# Altium schematic symbol library NXP_60_26022015.SCHLIB: 1306 symbols (part 6 of 28) (continued)
## BAT17
designator D?, comment Schottky barrier diode Planar Schottky barrier diode in a small SOT23 plastic SMD package.   AAL Eindhoven MK
footprint SOT23
pins: 1 A, 3 K

## BAT18
designator D?, comment Silicon planar diode Planar high performance band-switching diode in a small rectangular SOT23 SMD plastic package.   AAL Eindhoven MK
footprint SOT23
pins: 1 A, 3 K

## BAT46WH
designator ?, comment Single Schottky barrier diode Single planar Schottky barrier diode with an integrated guard ring for stress protection, encapsulated in a Surface-Mounted Device (SMD) plastic package.   AAL Eindhoven MK
footprint SOD123F
pins: 1 K, 2 A

## BAT46WJ
designator ?, comment Single Schottky barrier diode Single planar Schottky barrier diode with an integrated guard ring for stress protection, encapsulated in a Surface-Mounted Device (SMD) plastic package.   AAL Eindhoven MK
footprint SOD323(F)
pins: 1 K, 2 A

## BAT54
designator D?, comment Schottky barrier diode Planar Schottky barrier diode encapsulated in small plastic SMD packages. Single diodes and double diodes with different pinning are available   AAL Eindhoven MK
footprint SOT23
pins: 1 A, 3 K

## BAT54A
designator D?, comment Schottky barrier (double) diodes Planar Schottky barrier diodes encapsulated in a SOT23 small plastic SMD package. Single diodes and double diodes with different pinning are available.   AAL Eindhoven MK
footprint SOT23
pins: 1 K1, 2 K2, 3 A1A2

## BAT54AW
designator D?, comment Schottky barrier (double) diodes Planar Schottky barrier diodes encapsulated in a SOT23 small plastic SMD package. Single diodes and double diodes with different pinning are available.   AAL Eindhoven MK
footprint SOT323
pins: 1 K1, 2 K2, 3 A1A2

## BAT54C
designator D?, comment Schottky barrier (double) diodes Planar Schottky barrier diodes encapsulated in a SOT23 small plastic SMD package. Single diodes and double diodes with different pinning are available.   AAL Eindhoven MK
footprint SOT23
pins: 1 A1, 2 A2, 3 K1K2

## BAT54CM
designator D?, comment Schottky barrier (double) diodes Planar Schottky barrier diodes encapsulated in a SOT23 small plastic SMD package. Single diodes and double diodes with different pinning are available.   AAL Eindhoven MK
footprint SOT883(B)
pins: 1 A1, 2 A2, 3 K1K2

## BAT54CV
designator D?, comment Two Schottky barrier double diodes  Two planar Schottky barrier double diodes with common cathodes and an integrated guard ring for stress protection encapsulated in a SOT666 ultra small and flat lead Surface-Mounted Device (SMD) plastic package.   AAL Eindhoven MK
footprint SOT666
part A pins: 1 A1, 2 A2, 6 K1K2
part B pins: 3 K1K2, 4 A2, 5 A1

## BAT54CW
designator D?, comment Schottky barrier (double) diodes Planar Schottky barrier diodes encapsulated in a SOT23 small plastic SMD package. Single diodes and double diodes with different pinning are available.   AAL Eindhoven MK
footprint SOT323
pins: 1 A1, 2 A2, 3 K1K2

## BAT54H
designator D?, comment Schottky barrier diode Planar Schottky barrier diode encapsulated in small plastic SMD packages. Single diodes and double diodes with different pinning are available   AAL Eindhoven MK
footprint SOD123F
pins: 1 K, 2 A

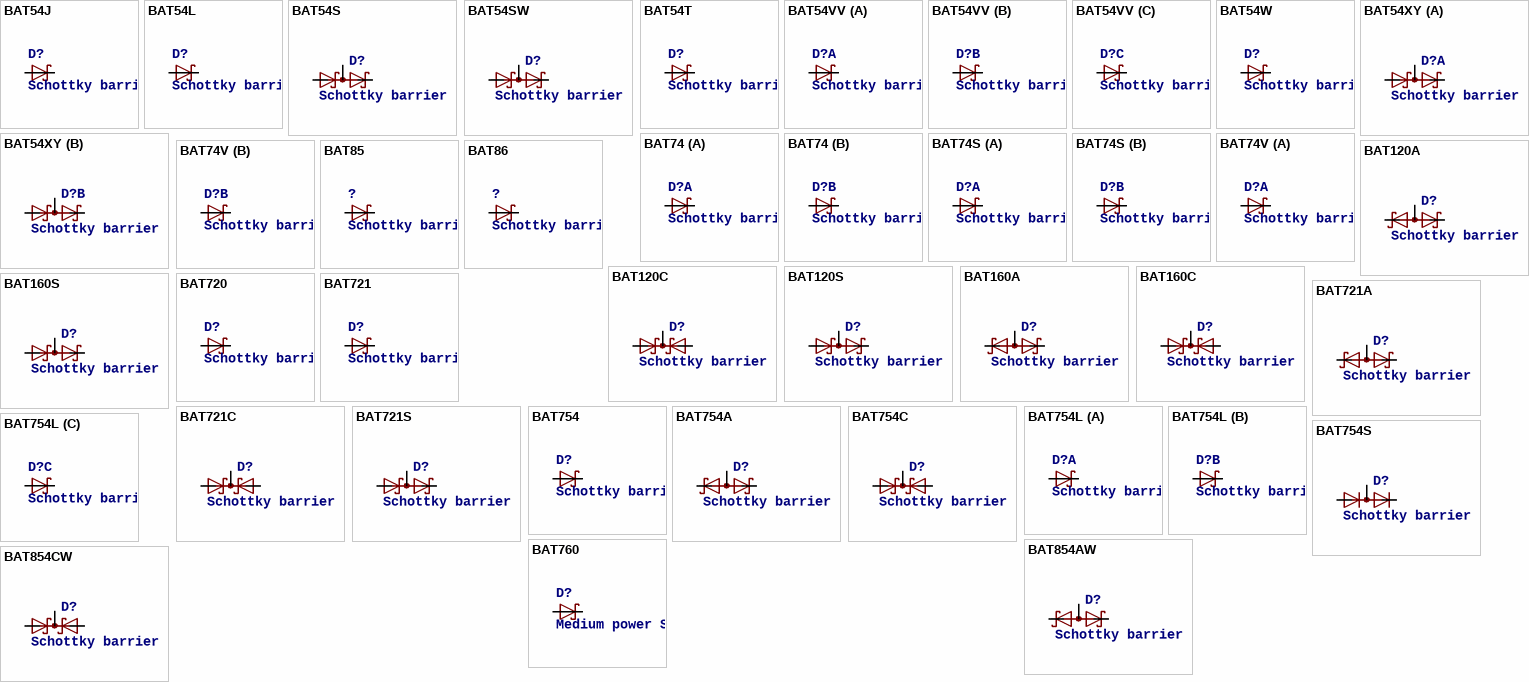
[diagram p31: symbols BAT54J to BAT854CW]

## BAT54J
designator D?, comment Schottky barrier diode Planar Schottky barrier diode encapsulated in small plastic SMD packages. Single diodes and double diodes with different pinning are available   AAL Eindhoven MK
footprint SOD323(F)
pins: 1 K, 2 A

## BAT54L
designator D?, comment Schottky barrier diode Planar Schottky barrier diode encapsulated in small plastic SMD packages. Single diodes and double diodes with different pinning are available   AAL Eindhoven MK
footprint SOD882(T)
pins: 1 K, 2 A

## BAT54S
designator D?, comment Schottky barrier (double) diodes Planar Schottky barrier diodes encapsulated in a SOT23 small plastic SMD package. Single diodes and double diodes with different pinning are available.   AAL Eindhoven MK
footprint SOT23
pins: 1 A1, 2 K2, 3 K1A2

## BAT54SW
designator D?, comment Schottky barrier (double) diodes Planar Schottky barrier diodes encapsulated in a SOT23 small plastic SMD package. Single diodes and double diodes with different pinning are available.   AAL Eindhoven MK
footprint SOT323
pins: 1 A1, 2 K2, 3 K1A2

## BAT54T
designator D?, comment Schottky barrier diode Planar Schottky barrier diode encapsulated in small plastic SMD packages. Single diodes and double diodes with different pinning are available   AAL Eindhoven MK
footprint SOT416
pins: 1 A, 3 K

## BAT54VV
designator D?, comment Schottky barrier triple diode Planar Schottky barrier triple diode with an integrated guard ring for stress protection. Three electrically isolated Schottky barrier diodes, encapsulated in a SOT666 ultra small SMD plastic package.   AAL Eindhoven MK
footprint SOT666
part A pins: 1 A, 6 K
part B pins: 2 A, 5 K
part C pins: 3 A, 4 K

## BAT54W
designator D?, comment Schottky barrier diode Planar Schottky barrier diode encapsulated in small plastic SMD packages. Single diodes and double diodes with different pinning are available   AAL Eindhoven MK
footprint SOT323
pins: 1 A, 3 K

## BAT54XY
designator D?, comment Schottky barrier quadruple diode in very small SOT363 package  Schottky barrier quadruple diode with an integrated guard ring for stress protection. Two electrically isolated dual Schottky barrier diodes series, encapsulated in a SOT363 very small SMD plastic package.   AAL Eindhoven MK
footprint SOT363
part A pins: 1 A1, 2 K2, 6 K1A2
part B pins: 3 K1A2, 4 A1, 5 K2

## BAT74
designator D?, comment Schottky barrier double diode Planar Schottky barrier double diode with an integrated guard ring for stress protection. Two electrically isolated Schottky barrier diodes, encapsulated in a small SOT143B Surface-Mounted Device (SMD) plastic package.   AAL Eindhoven MK
footprint SOT143(B)
part A pins: 1 K, 4 A
part B pins: 2 K, 3 A

## BAT74S
designator D?, comment Schottky barrier double diode Planar Schottky barrier double diode with an integrated guard ring for stress protection. Two electrically isolated Schottky barrier diodes, encapsulated in a small SOT143B Surface-Mounted Device (SMD) plastic package.   AAL Eindhoven MK
footprint SOT363
part A pins: 1 A, 6 K
part B pins: 3 K, 4 A

## BAT74V
designator D?, comment Schottky barrier double diode Planar Schottky barrier double diode with an integrated guard ring for stress protection. Two electrically isolated Schottky barrier diodes, encapsulated in a small SOT143B Surface-Mounted Device (SMD) plastic package.   AAL Eindhoven MK
footprint SOT666
part A pins: 1 A, 6 K
part B pins: 3 K, 4 A

## BAT85
designator ?, comment Schottky barrier diode  Planar Schottky barrier diode with an integrated protection ring against static discharges, encapsulated in a hermetically-sealed subminiature SOD68 (DO-34) package. The diode is suitable for mounting on a 2 E (5.08 mm) pitch.   AAL Eindhoven MK
footprint SOD68
pins: A, C K

## BAT86
designator ?, comment Schottky barrier diode  Planar Schottky barrier diode with an integrated protection ring against static discharges, encapsulated in a hermetically-sealed subminiature SOD68 (DO-34) package. The diode is suitable for mounting on a 2 E (5.08 mm) pitch.   AAL Eindhoven MK
footprint SOD68
pins: A, C K

## BAT120A
designator D?, comment Schottky barrier double diodes Planar Schottky barrier double diodes encapsulated in a SOT223 plastic SMD package.   AAL Eindhoven MK
footprint SOT223
pins: 1 K1, 3 K2, 4 A1A2

## BAT120C
designator D?, comment Schottky barrier double diodes Planar Schottky barrier double diodes encapsulated in a SOT223 plastic SMD package.   AAL Eindhoven MK
footprint SOT223
pins: 1 A1, 3 A2, 4 K1K2

## BAT120S
designator D?, comment Schottky barrier double diodes Planar Schottky barrier double diodes encapsulated in a SOT223 plastic SMD package.   AAL Eindhoven MK
footprint SOT223
pins: 1 A1, 3 K2, 4 K1A2

## BAT160A
designator D?, comment Schottky barrier double diodes Planar Schottky barrier double diodes encapsulated in a SOT223 plastic SMD package.   AAL Eindhoven MK
footprint SOT223
pins: 1 K1, 3 K2, 4 A1A2

## BAT160C
designator D?, comment Schottky barrier double diodes Planar Schottky barrier double diodes encapsulated in a SOT223 plastic SMD package.   AAL Eindhoven MK
footprint SOT223
pins: 1 A1, 3 A2, 4 K1K2

## BAT160S
designator D?, comment Schottky barrier double diodes Planar Schottky barrier double diodes encapsulated in a SOT223 plastic SMD package.   AAL Eindhoven MK
footprint SOT223
pins: 1 A1, 3 K2, 4 K1A2

## BAT720
designator D?, comment Schottky barrier diode Planar Schottky barrier diode with an integrated guard ring for stress protection in a small SOT23 plastic SMD package.   AAL Eindhoven MK
footprint SOT23
pins: 1 A, 3 K

## BAT721
designator D?, comment Schottky barrier diodes in small packages Planar Schottky barrier diodes with an integrated guard ring for stress protection. Encapsulated in small Surface-Mounted Device (SMD) plastic packages.   AAL Eindhoven MK
footprint SOT23
pins: 1 A, 3 K

## BAT721A
designator D?, comment Schottky barrier diodes in small packages Planar Schottky barrier diodes with an integrated guard ring for stress protection. Encapsulated in small Surface-Mounted Device (SMD) plastic packages.   AAL Eindhoven MK
footprint SOT23
pins: 1 K1, 2 K2, 3 A1A2

## BAT721C
designator D?, comment Schottky barrier diodes in small packages Planar Schottky barrier diodes with an integrated guard ring for stress protection. Encapsulated in small Surface-Mounted Device (SMD) plastic packages.   AAL Eindhoven MK
footprint SOT23
pins: 1 A1, 2 A2, 3 K1K2

## BAT721S
designator D?, comment Schottky barrier diodes in small packages Planar Schottky barrier diodes with an integrated guard ring for stress protection. Encapsulated in small Surface-Mounted Device (SMD) plastic packages.   AAL Eindhoven MK
footprint SOT23
pins: 1 A1, 2 K2, 3 K1A2

## BAT754
designator D?, comment Schottky barrier diode Planar Schottky barrier diodes encapsulated in a SOT23 small plastic SMD package. Low forward voltage selection of the BAT54 series. Single diodes and double diodes with different pinning are available.   AAL Eindhoven MK
footprint SOT23
pins: 1 A, 3 K

## BAT754A
designator D?, comment Schottky barrier (double) diodes Planar Schottky barrier diodes encapsulated in a SOT23 small plastic SMD package. Low forward voltage selection of the BAT54 series. Single diodes and double diodes with different pinning are available.   AAL Eindhoven MK
footprint SOT23
pins: 1 K1, 2 K2, 3 A1A2

## BAT754C
designator D?, comment Schottky barrier (double) diodes Planar Schottky barrier diodes encapsulated in a SOT23 small plastic SMD package. Low forward voltage selection of the BAT54 series. Single diodes and double diodes with different pinning are available.   AAL Eindhoven MK
footprint SOT23
pins: 1 A1, 2 A2, 3 K1K2

## BAT754L
designator D?, comment Schottky barrier triple diode Three internal (galvanic) isolated silicon epitaxial Schottky barrier diodes in a SOT363 small SMD plastic package.   AAL Eindhoven MK
footprint SOT363
part A pins: 1 A, 6 K
part B pins: 2 A, 5 K
part C pins: 3 A, 4 K

## BAT754S
designator D?, comment Schottky barrier (double) diodes Planar Schottky barrier diodes encapsulated in a SOT23 small plastic SMD package. Low forward voltage selection of the BAT54 series. Single diodes and double diodes with different pinning are available.   AAL Eindhoven MK
footprint SOT23
pins: 1 A1, 2 K2, 3 K1A2

## BAT760
designator D?, comment Medium power Schottky barrier single diode Planar medium power Schottky barrier single diode with an integrated guard ring for stress protection, encapsulated in a SOD323 (SC-76) very small Surface-Mounted Device SMD plastic package.   AAL Eindhoven MK
footprint SOD323(F)
pins: 1 K, 2 A

## BAT854AW
designator D?, comment Schottky barrier (double) diodes Planar Schottky barrier diodes encapsulated in a SOT323 very small SMD plastic package. Single diodes and double diodes with different pinning are available.   AAL Eindhoven MK
footprint SOT323
pins: 1 K1, 2 K2, 3 A1A2

## BAT854CW
designator D?, comment Schottky barrier (double) diodes Planar Schottky barrier diodes encapsulated in a SOT323 very small SMD plastic package. Single diodes and double diodes with different pinning are available.   AAL Eindhoven MK
footprint SOT323
pins: 1 A1, 2 A2, 3 K1K2

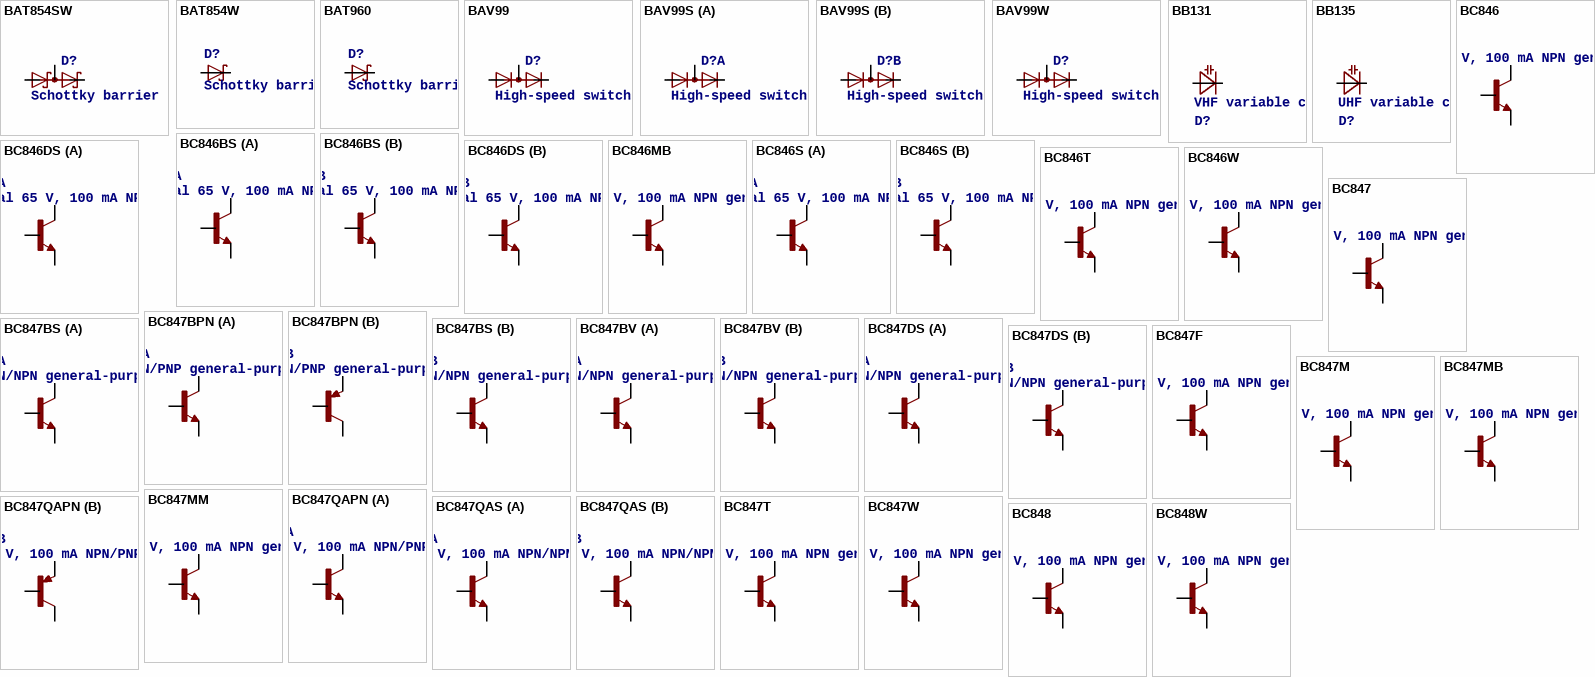
[diagram p32: symbols BAT854SW to BC848W]

## BAT854SW
designator D?, comment Schottky barrier (double) diodes Planar Schottky barrier diodes encapsulated in a SOT323 very small SMD plastic package. Single diodes and double diodes with different pinning are available.   AAL Eindhoven MK
footprint SOT323
pins: 1 A1, 2 K2, 3 K1A2

## BAT854W
designator D?, comment Schottky barrier (double) diodes Planar Schottky barrier diodes encapsulated in a SOT323 very small SMD plastic package. Single diodes and double diodes with different pinning are available.   AAL Eindhoven MK
footprint SOT323
pins: 1 A, 3 K

## BAT960
designator D?, comment Schottky barrier diode  Planar Schottky barrier diode with an integrated guard ring for stress protection in a SOT666 ultra small SMD plastic package.   AAL Eindhoven MK
footprint SOT666
pins: 1 2 5 6 K, 3 4 A

## BAV99
designator D?, comment High-speed switching diode High-speed switching diodes, encapsulated in small Surface-Mounted Device (SMD) plastic packages.    AAL Eindhoven MK
footprint SOT23
pins: 1 A1, 2 K2, 3 K1A2

## BAV99S
designator D?, comment High-speed switching diode High-speed switching diodes, encapsulated in small Surface-Mounted Device (SMD) plastic packages.    AAL Eindhoven MK
footprint SOT363
part A pins: 1 A1, 2 K2, 6 K1A2
part B pins: 3 K1A2, 4 A1, 5 K2

## BAV99W
designator D?, comment High-speed switching diode High-speed switching diodes, encapsulated in small Surface-Mounted Device (SMD) plastic packages.    AAL Eindhoven MK
footprint SOT323
pins: 1 A1, 2 K2, 3 K1A2

## BB131
designator D?, comment VHF variable capacitance diode The BB131 is a variable capacitance diode, fabricated in planar technology, and encapsulated in the SOD323 (SC-76) very small plastic SMD package   AAL Eindhoven MK
footprint SOD323(F)
pins: 1 K, 2 A

## BB135
designator D?, comment UHF variable capacitance diode The BB135 is a variable capacitance diode, fabricated in planar technology, and encapsulated in the SOD323 very small plastic SMD package.The matched type, BB134 has the same specification.e   AAL Eindhoven MK
footprint SOD323(F)
pins: 1 K, 2 A

## BC846
designator T?, comment 65 V, 100 mA NPN general-purpose transistors    AAL Eindhoven  MK
footprint SOT23
pins: 1 B, 2 E, 3 C

## BC846BS
designator T?, comment Dual 65 V, 100 mA NPN/NPN general-purpose transistor    AAL Eindhoven MK
footprint SOT363
part A pins: 1 E, 2 B, 6 C
part B pins: 3 C, 4 E, 5 B

## BC846DS
designator T?, comment Dual 65 V, 100 mA NPN/NPN general-purpose transistor    AAL Eindhoven MK
footprint SOT457
part A pins: 1 E, 2 B, 6 C
part B pins: 3 C, 4 E, 5 B

## BC846MB
designator T?, comment 65 V, 100 mA NPN general-purpose transistors    AAL Eindhoven  MK
footprint SOT883(B)
pins: 1 B, 2 E, 3 C

## BC846S
designator T?, comment Dual 65 V, 100 mA NPN/NPN general-purpose transistor    AAL Eindhoven MK
footprint SOT363
part A pins: 1 E, 2 B, 6 C
part B pins: 3 C, 4 E, 5 B

## BC846T
designator T?, comment 65 V, 100 mA NPN general-purpose transistors    AAL Eindhoven  MK
footprint SOT416
pins: 1 B, 2 E, 3 C

## BC846W
designator T?, comment 65 V, 100 mA NPN general-purpose transistors    AAL Eindhoven  MK
footprint SOT323
pins: 1 B, 2 E, 3 C

## BC847
designator T?, comment 45 V, 100 mA NPN general-purpose transistors NPN general-purpose transistor    AAL Eindhoven MK
footprint SOT23
pins: 1 B, 2 E, 3 C

## BC847BPN
designator T?, comment NPN/PNP general-purpose transistor pair in a very small SOT363 (SC-88) Surface-Mounted Device (SMD) plastic package.    AAL Eindhoven MK
footprint SOT363
part A pins: 1 E, 2 B, 6 C
part B pins: 3 C, 4 E, 5 B

## BC847BS
designator T?, comment NPN/NPN general-purpose transistor pair in a very small SOT363 (SC-88) Surface-Mounted Device (SMD) plastic package.    AAL Eindhoven MK
footprint SOT363
part A pins: 1 E, 2 B, 6 C
part B pins: 3 C, 4 E, 5 B

## BC847BV
designator T?, comment NPN/NPN general-purpose transistor pair in a very small SOT363 (SC-88) Surface-Mounted Device (SMD) plastic package.    AAL Eindhoven MK
footprint SOT666
part A pins: 1 E, 2 B, 6 C
part B pins: 3 C, 4 E, 5 B

## BC847DS
designator T?, comment NPN/NPN general-purpose transistor pair in a small SOT457 (SC-74) Surface-Mounted Device (SMD) plastic package.    AAL Eindhoven MK
footprint SOT457
part A pins: 1 E, 2 B, 6 C
part B pins: 3 C, 4 E, 5 B

## BC847F
designator T?, comment 45 V, 100 mA NPN general-purpose transistors NPN general-purpose transistor    AAL Eindhoven MK
footprint SOT490
pins: 1 B, 2 E, 3 C

## BC847M
designator T?, comment 45 V, 100 mA NPN general-purpose transistors NPN general-purpose transistor    AAL Eindhoven MK
footprint SOT883(B)
pins: 1 B, 2 E, 3 C

## BC847MB
designator T?, comment 45 V, 100 mA NPN general-purpose transistors NPN general-purpose transistor    AAL Eindhoven MK
footprint SOT883(B)
pins: 1 B, 2 E, 3 C

## BC847MM
designator T?, comment 45 V, 100 mA NPN general-purpose transistors NPN general-purpose transistor    AAL Eindhoven MK
footprint SOT1263
pins: 1 B, 2 E, 3 C

## BC847QAPN
designator T?, comment 45 V, 100 mA NPN/PNP general-purpose transistor NPN/PNP general-purpose transistor in a leadless ultra small DFN1010B-6 (SOT1216) Surface-Mounted Device (SMD) plastic package.    AAL Eindhoven MK
footprint SOT1216
part A pins: 1 E, 2 B, 6 C
part B pins: 3 C, 4 E, 5 B

## BC847QAS
designator T?, comment 45 V, 100 mA NPN/NPN general-purpose transistor NPN/NPN general-purpose transistor in a leadless ultra small DFN1010B-6 (SOT1216) Surface-Mounted Device (SMD) plastic package. PNP/PNP complement: BC857QAS. NPN/PNP complement: BC847QAPN.    AAL Eindhoven MK
footprint SOT1216
part A pins: 1 E, 2 B, 6 C
part B pins: 3 C, 4 E, 5 B

## BC847T
designator T?, comment 45 V, 100 mA NPN general-purpose transistors NPN general-purpose transistor    AAL Eindhoven MK
footprint SOT416
pins: 1 B, 2 E, 3 C

## BC847W
designator T?, comment 45 V, 100 mA NPN general-purpose transistors NPN general-purpose transistor    AAL Eindhoven MK
footprint SOT323
pins: 1 B, 2 E, 3 C

## BC848
designator T?, comment 30 V, 100 mA NPN general-purpose transistors    AAL Eindhoven MK
footprint SOT23
pins: 1 B, 2 E, 3 C

## BC848W
designator T?, comment 30 V, 100 mA NPN general-purpose transistors    AAL Eindhoven MK
footprint SOT323
pins: 1 B, 2 E, 3 C

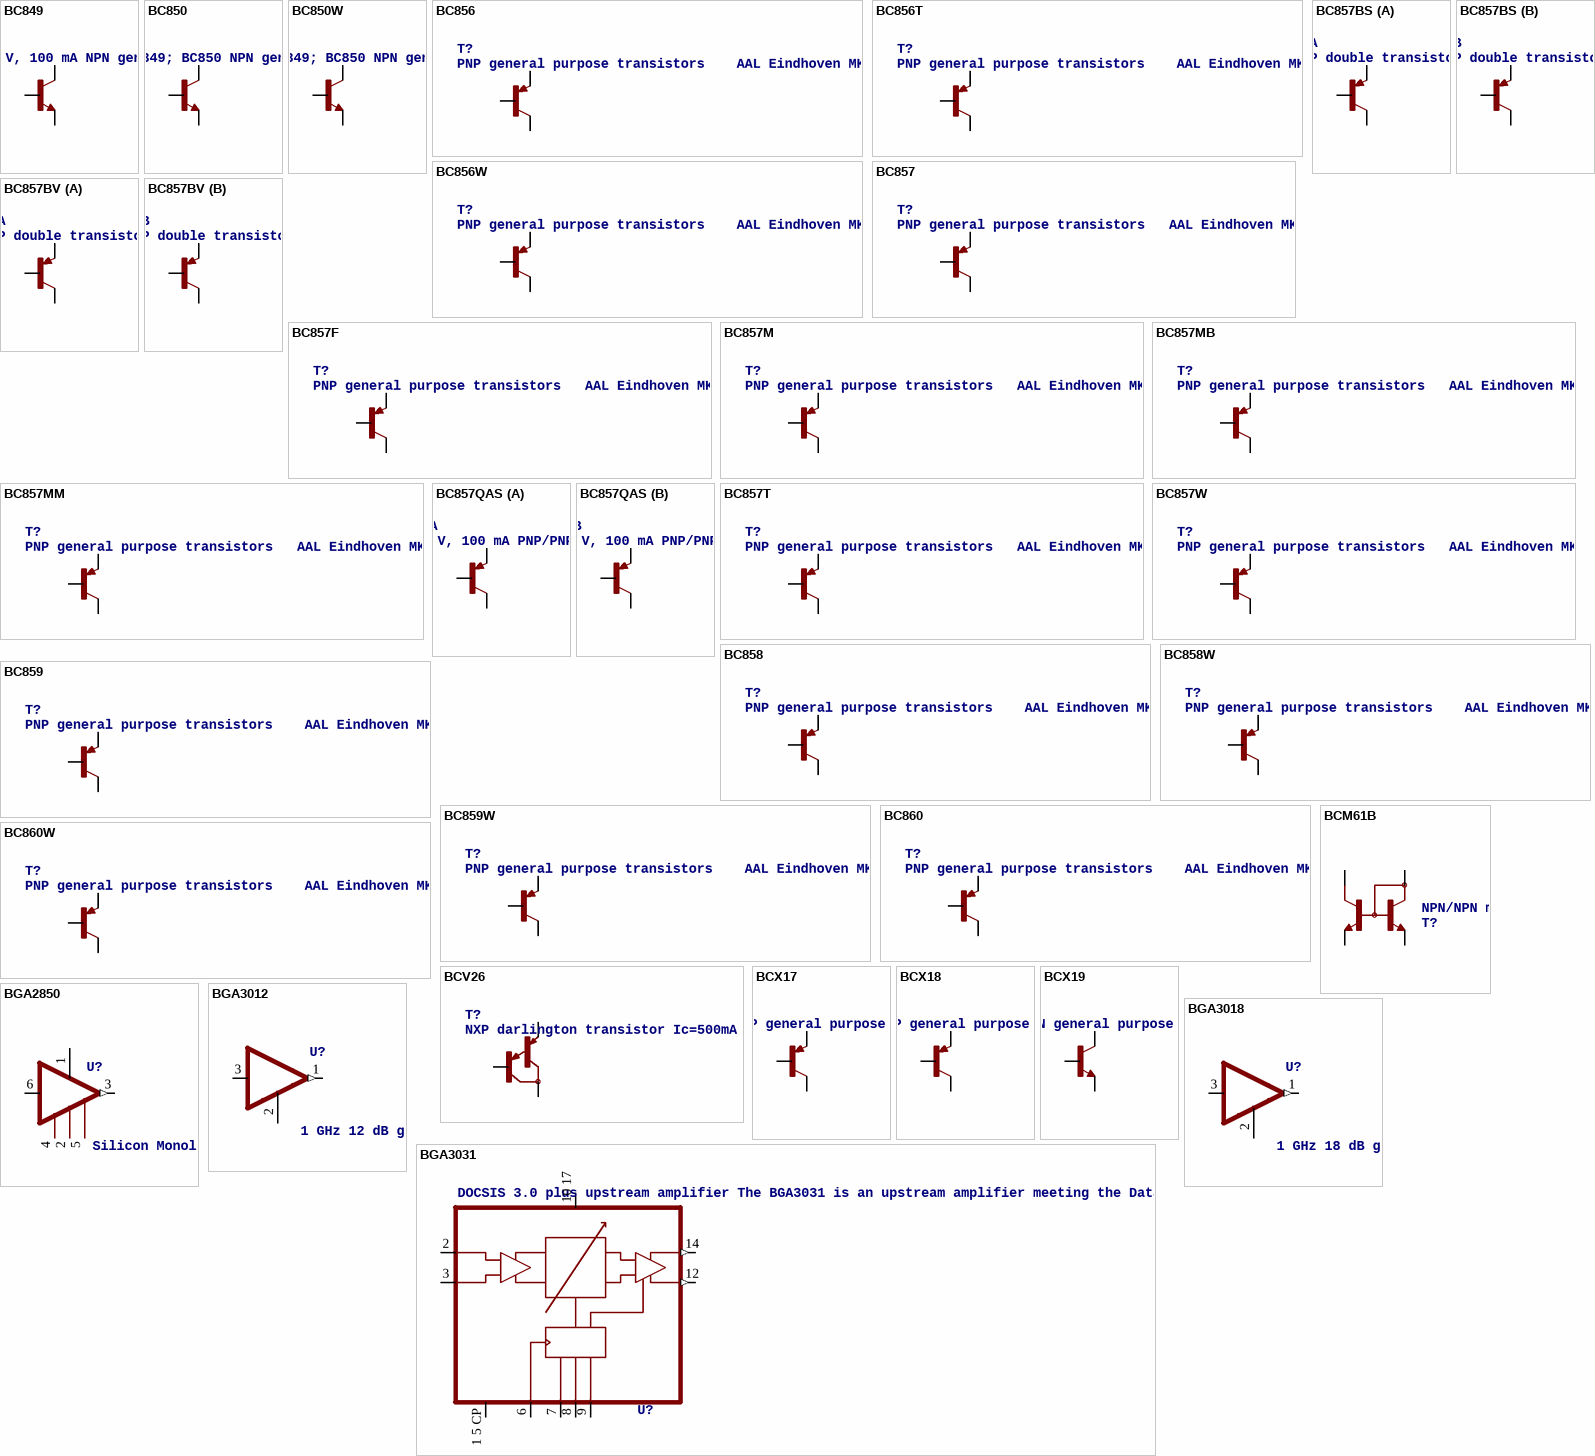
[diagram p33: symbols BC849 to BGA3031]

## BC849
designator T?, comment 45 V, 100 mA NPN general-purpose transistors    AAL Eindhoven MK
footprint SOT23
pins: 1 B, 2 E, 3 C

## BC850
designator T?, comment BC849; BC850 NPN general purpose transistors    AAL Eindhoven MK
footprint SOT23
pins: 1 B, 2 E, 3 C

## BC850W
designator T?, comment BC849; BC850 NPN general purpose transistors    AAL Eindhoven MK
footprint SOT323
pins: 1 B, 2 E, 3 C

## BC856
designator T?, comment PNP general purpose transistors    AAL Eindhoven MK
footprint SOT23
pins: 1 B, 2 E, 3 C

## BC856T
designator T?, comment PNP general purpose transistors    AAL Eindhoven MK
footprint SOT416
pins: 1 B, 2 E, 3 C

## BC856W
designator T?, comment PNP general purpose transistors    AAL Eindhoven MK
footprint SOT323
pins: 1 B, 2 E, 3 C

## BC857
designator T?, comment PNP general purpose transistors   AAL Eindhoven MK
footprint SOT23
pins: 1 B, 2 E, 3 C

## BC857BS
designator T?, comment PNP double transistor in an SC-88; SOT363 plastic package.    AAL Eindhoven MK
footprint SOT363
part A pins: 1 E, 2 B, 6 C
part B pins: 3 C, 4 E, 5 B

## BC857BV
designator T?, comment PNP double transistor in a SOT666 plastic package. NPN complement: BC847BV.    AAL Eindhoven MK
footprint SOT666
part A pins: 1 E, 2 B, 6 C
part B pins: 3 C, 4 E, 5 B

## BC857F
designator T?, comment PNP general purpose transistors   AAL Eindhoven MK
footprint SOT490
pins: 1 B, 2 E, 3 C

## BC857M
designator T?, comment PNP general purpose transistors   AAL Eindhoven MK
footprint SOT883(B)
pins: 1 B, 2 E, 3 C

## BC857MB
designator T?, comment PNP general purpose transistors   AAL Eindhoven MK
footprint SOT883(B)
pins: 1 B, 2 E, 3 C

## BC857MM
designator T?, comment PNP general purpose transistors   AAL Eindhoven MK
footprint SOT1263
pins: 1 B, 2 E, 3 C

## BC857QAS
designator T?, comment 45 V, 100 mA PNP/PNP general-purpose transistor PNP/PNP general-purpose transistor in a leadless ultra small DFN1010B-6 (SOT1216) Surface-Mounted Device (SMD) plastic package. NPN/NPN complement: BC847QAS. NPN/PNP complement: BC847QAPN.    AAL Eindhoven MK
footprint SOT1216
part A pins: 1 E, 2 B, 6 C
part B pins: 3 C, 4 E, 5 B

## BC857T
designator T?, comment PNP general purpose transistors   AAL Eindhoven MK
footprint SOT416
pins: 1 B, 2 E, 3 C

## BC857W
designator T?, comment PNP general purpose transistors   AAL Eindhoven MK
footprint SOT323
pins: 1 B, 2 E, 3 C

## BC858
designator T?, comment PNP general purpose transistors    AAL Eindhoven MK
footprint SOT23
pins: 1 B, 2 E, 3 C

## BC858W
designator T?, comment PNP general purpose transistors    AAL Eindhoven MK
footprint SOT323
pins: 1 B, 2 E, 3 C

## BC859
designator T?, comment PNP general purpose transistors    AAL Eindhoven MK
footprint SOT23
pins: 1 B, 2 E, 3 C

## BC859W
designator T?, comment PNP general purpose transistors    AAL Eindhoven MK
footprint SOT323
pins: 1 B, 2 E, 3 C

## BC860
designator T?, comment PNP general purpose transistors    AAL Eindhoven MK
footprint SOT23
pins: 1 B, 2 E, 3 C

## BC860W
designator T?, comment PNP general purpose transistors    AAL Eindhoven MK
footprint SOT323
pins: 1 B, 2 E, 3 C

## BCM61B
designator T?, comment NPN/NPN matched double transistor NPN/NPN matched double transistor in a SOT143B small Surface-Mounted Device (SMD) plastic package. Matched version of BCV61. PNP/PNP equivalent: BCM62B    AAL Eindhoven MK
footprint SOT143(B)
pins: 1 CTR2B, 2 CTR1, 3 ETR1, 4 ETR2

## BCV26
designator T?, comment NXP darlington transistor Ic=500mA
footprint SOT23
pins: 1 B, 2 E, 3 C

## BCX17
designator T?, comment PNP general purpose transistors  PNP transistor in a SOT23 plastic package. NPN complement: BCX19.   AAL Eindhoven MK
footprint SOT23
pins: 1 B, 2 E, 3 C

## BCX18
designator T?, comment PNP general purpose transistors  PNP transistor in a SOT23 plastic package. NPN complement: BCX19.   AAL Eindhoven MK
footprint SOT23
pins: 1 B, 2 E, 3 C

## BCX19
designator T?, comment NPN general purpose transistor NPN transistor in a SOT23 plastic package. PNP complement: BCX17.   AAL Eindhoven MK
footprint SOT23
pins: 1 B, 2 E, 3 C

## BGA2850
designator U?, comment Silicon Monolithic Microwave Integrated Circuit (MMIC) wideband amplifier with internal matching circuit in a 6-pin SOT363 plastic SMD package.   AAL Eindhoven MV+ MK
12NC: 9352 900 54115
footprint SOT363
pins: 1 VCC (power), 2 GND2@1 (power), 3 OUT (out), 4 GND1 (power), 5 GND2@2 (power), 6 -IN

## BGA3012
designator U?, comment 1 GHz 12 dB gain wideband amplifier MMIC The BGA3012 MMIC is a wideband amplifier with internal biasing. It is designed specifically for high linearity CATV line extenders and drop amplifiers over a frequency range of 5 MHz to 1006 MHz. The LNA is housed in a lead free 3-pin SOT89 package.    AAL Eindhoven MK
footprint SOT89
pins: 1 OUT (out), 2 GND (power), 3 IN

## BGA3018
designator U?, comment 1 GHz 18 dB gain wideband amplifier MMIC The BGA3018 MMIC is a wideband amplifier with internal biasing. It is designed specifically for high linearity CATV line extenders and drop amplifiers over a frequency range of 5 MHz to 1006 MHz. The LNA is housed in a lead free 3-pin SOT89 package.    AAL Eindhoven MK
footprint SOT89
pins: 1 OUT (out), 2 GND (power), 3 IN

## BGA3031
designator U?, comment DOCSIS 3.0 plus upstream amplifier The BGA3031 is an upstream amplifier meeting the Data Over Cable Service Interface Specifications (DOCSIS 3.0). It is designed for cable modem, CATV set top box and VoIP modem applications. The device operates from 5 MHz to 85 MHz. The BGA3031 provides 58 dB gain control range in 1 dB increments with high incremental accuracy. Its maximum gain setting delivers 34 dB voltage gain and a superior linear performance. It supports high output power levels, exceeding the DOCSIS 3.0 power levels while minimizing distortion and output noise levels. The BGA3031 is capable of transmitting 1 to 8 64-QAM and 1 to 8 QPSK modulated carriers while meeting the DOCSIS 3.0 ACLR specification under DOCSIS 3.0 + 4 dB conditions. The BGA3031 operates at 5 V supply. The gain is controlled via a 3-wire serial interface. The current consumption can be reduced in 4 steps via the serial interface. This enables the user to optimize between DC power efficiency and linearity. In addition the current is automatically reduced at lower gain settings while preserving the linearity performance. In disable mode the device draws typical 6 mA while it still can be programmed to new gain and current settings. The BGA3031 is housed in 20 pins 5 mm  5 mm leadless HVQFN package.    AAL Eindhoven MK
footprint SOT662-1
pins: 1 5 CP GND (power), 2 IN_P, 3 IN_N, 6 CLK, 7 DATA, 8 CS, 9 TX_EN, 10 17 VCC (power), 12 OUT_N (out), 14 OUT_P (out)

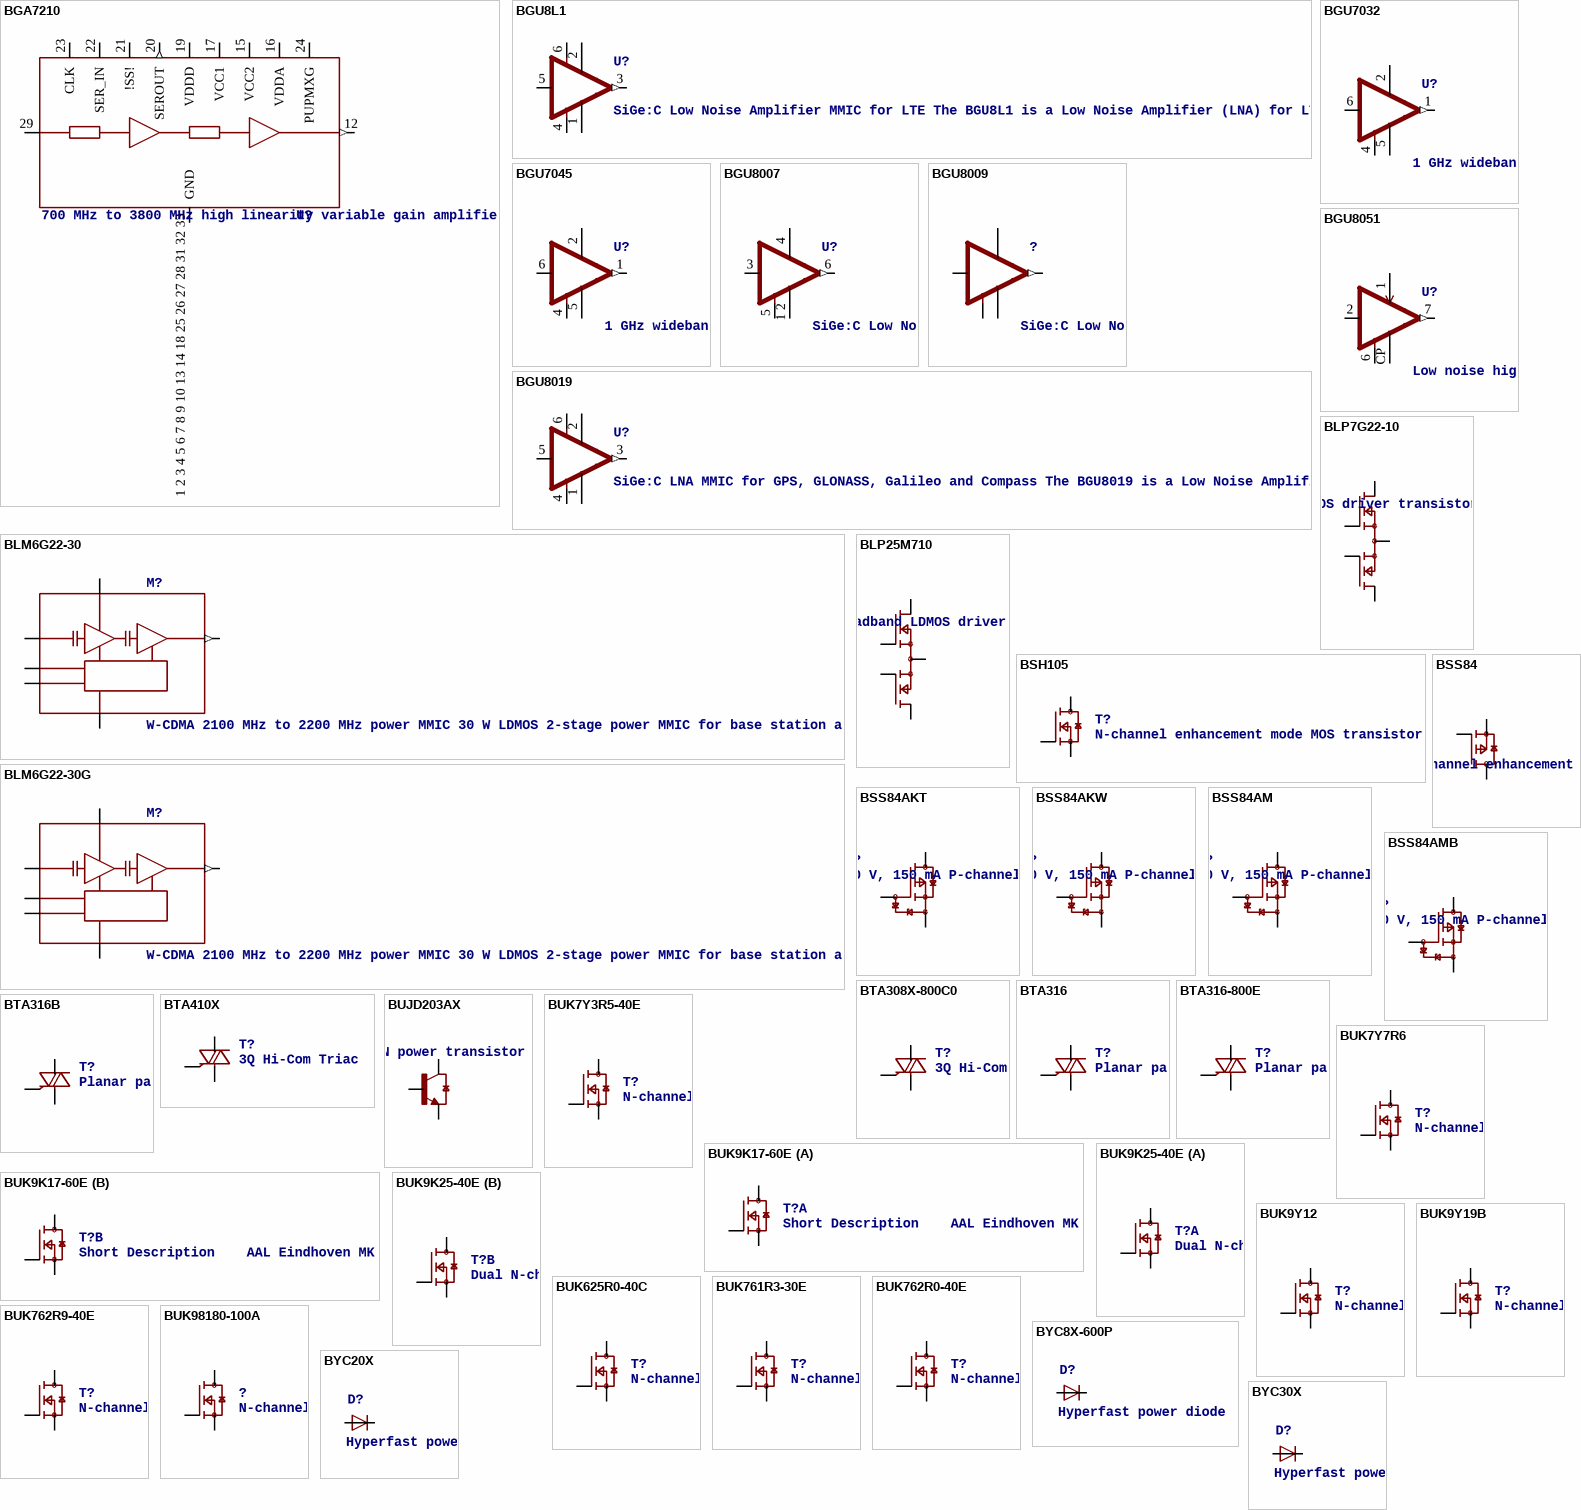
[diagram p34: symbols BGA7210 to BYC30X]

## BGA7210
designator U?, comment 700 MHz to 3800 MHz high linearity variable gain amplifier
footprint SOT617-3
pins: 1 2 3 4 5 6 7 8 9 10 13 14 18 25 26 27 28 31 32 33 GND (power), 12 RF_OUT (out), 15 VCC2 (power), 16 VDDA (power), 17 VCC1 (power), 19 VDDD (power), 20 SEROUT (out), 21 !SS!, 22 SER_IN, 23 CLK, 24 PUPMXG, 29 RF_IN